# Altium integrated library PS32-lite-revA.IntLib: 20 symbols
Pins are listed as number, name and electrical type; pins without a type are passive.

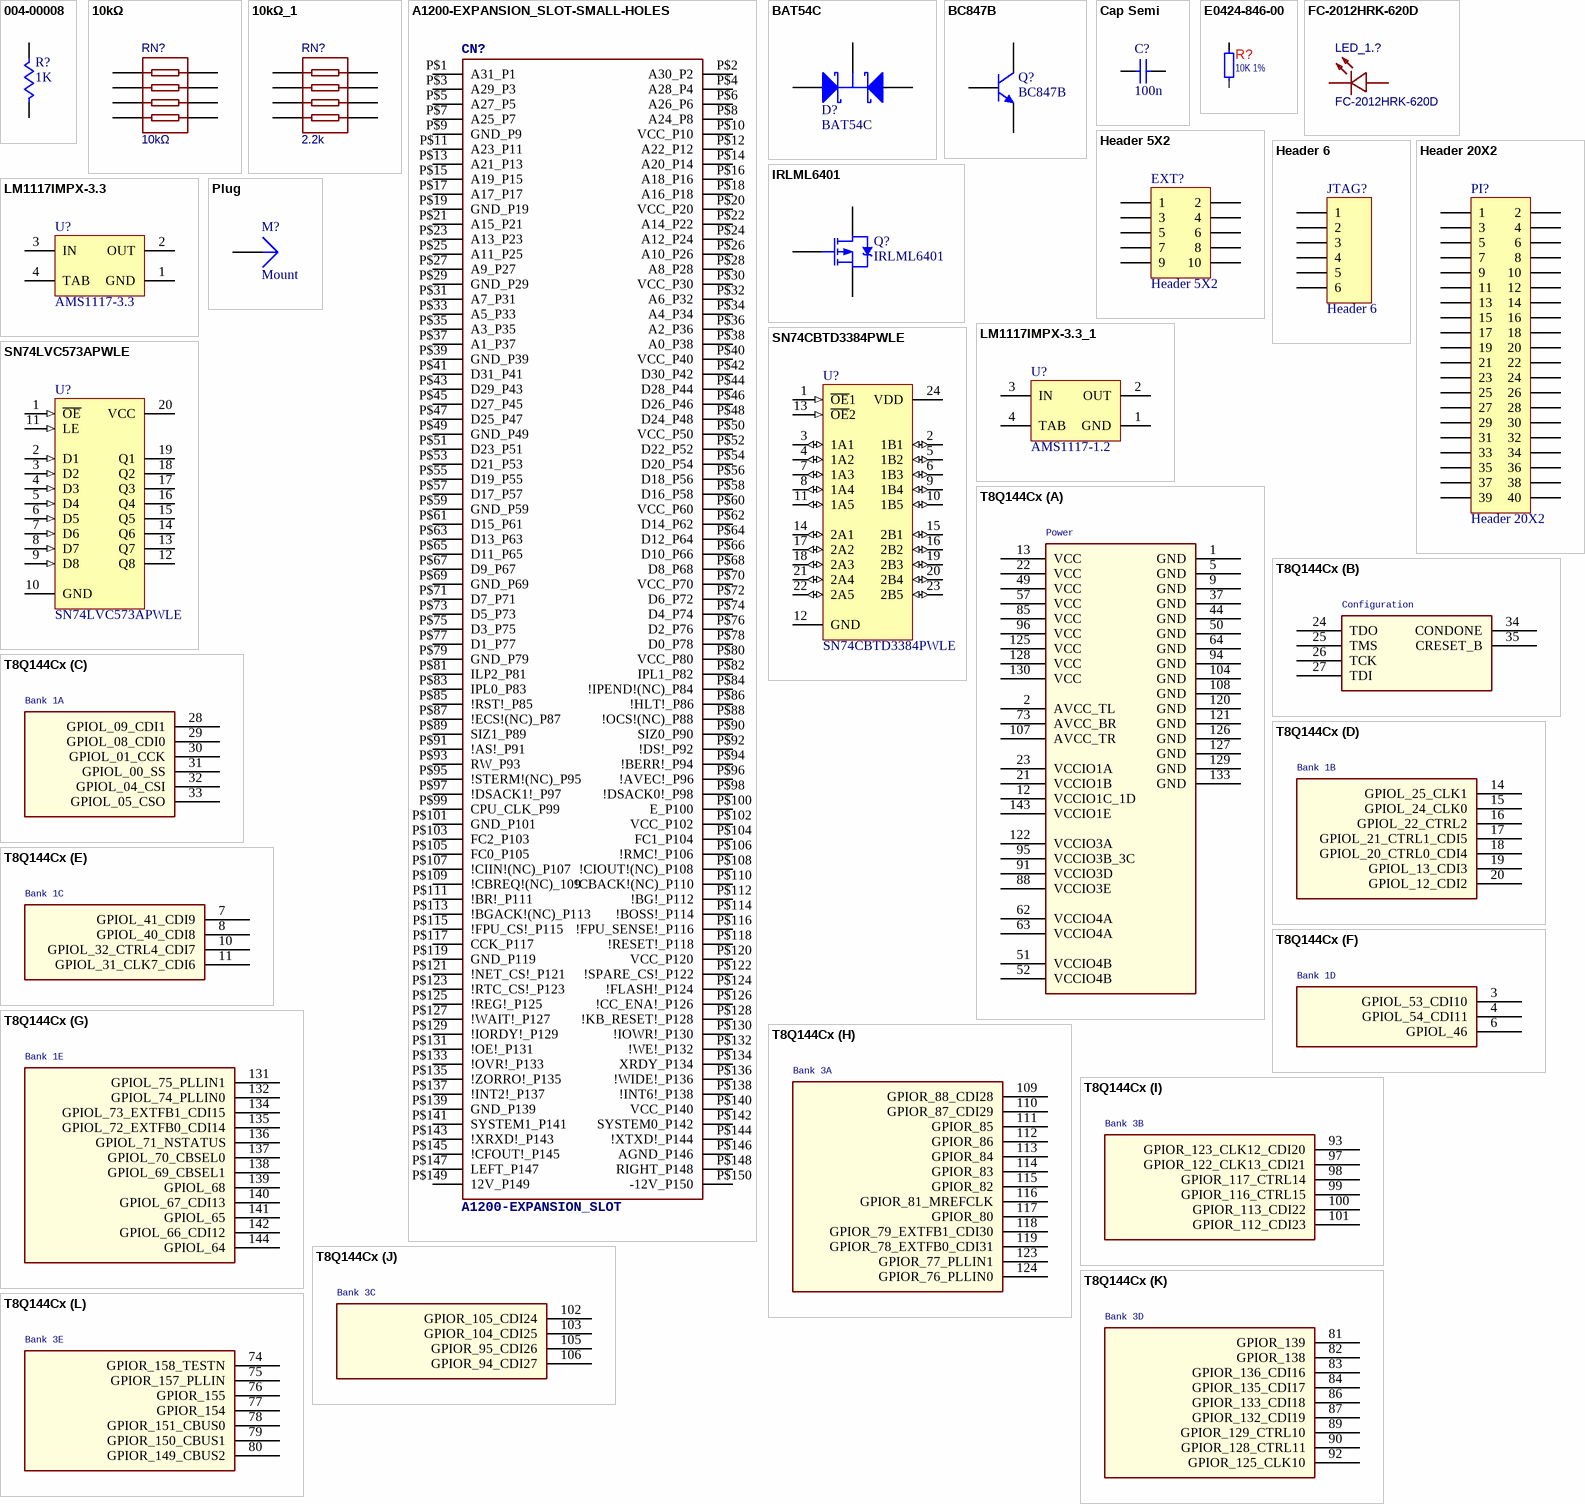
[diagram p0: symbols 004-00008 to T8Q144Cx]

## 004-00008
designator R?, comment 1K
RES 22 OHM 1/16W 5% 0402; Part Number: 009-00020; Manufacturer1 Part Number: RMCF0402JT22R0; Manufacturer1: Stackpole Electronics; Tolerance: 0.05; Value: 22; Power: 1/16W; Package: 1005, EIA 0402, Chip Resistor, 2-Leads, Body 1.00x0.50mm, IPC High Density
footprint 005-00009
footprint 005-00008 (1005, EIA 0402, Chip Capacitor, 2-Leads, Body 1.00x0.50mm, IPC High Density)
footprint 1608[0603] (Chip Capacitor, Body 1.6x0.8mm, IPC High Density)
pins: 1, 2

## 10kΩ
designator RN?
BOM_Manufacturer: UniOhm; BOM_Manufacturer Part: 4D03WGJ0103T5E; nameAlias: Resistance; Resistance (Ohms): 10K; BOM_Supplier: LCSC; BOM_Supplier Part: C29718; BOM_JLCPCB Part Class: Basic Part; spicePre: R; spiceSymbolName: 4D03WGJ0103T5E
footprint RES-ARRAY-SMD_0603-8P-L3.2-W1.6-BL
footprint RES-ARRAY-SMD_0402-8P-L2.0-W1.0-BL (Footprint not found)
footprint RES-ARRAY-SMD_0603-8P-L3.2-W1.6-BL (Footprint not found)
pins: 1, 2, 3, 4, 5, 6, 7, 8

## 10kΩ_1
designator RN?, comment 2.2k
BOM_Manufacturer: UniOhm; BOM_Manufacturer Part: 4D03WGJ0103T5E; nameAlias: Resistance; Resistance (Ohms): 10K; BOM_Supplier: LCSC; BOM_Supplier Part: C29718; BOM_JLCPCB Part Class: Basic Part; spicePre: R; spiceSymbolName: 4D03WGJ0103T5E
footprint RES-ARRAY-SMD_0603-8P-L3.2-W1.6-BL
footprint RES-ARRAY-SMD_0402-8P-L2.0-W1.0-BL (Footprint not found)
footprint RES-ARRAY-SMD_0603-8P-L3.2-W1.6-BL (Footprint not found)
pins: 1, 2, 3, 4, 5, 6, 7, 8

## A1200-EXPANSION_SLOT-SMALL-HOLES
designator CN?, comment A1200-EXPANSION_SLOT
footprint CON_150_SMALL_HOLES
footprint CON_150
pins: P$1 A31_P1, P$2 A30_P2, P$3 A29_P3, P$4 A28_P4, P$5 A27_P5, P$6 A26_P6, P$7 A25_P7, P$8 A24_P8, P$9 GND_P9, P$10 VCC_P10, P$11 A23_P11, P$12 A22_P12, P$13 A21_P13, P$14 A20_P14, P$15 A19_P15, P$16 A18_P16, P$17 A17_P17, P$18 A16_P18, P$19 GND_P19, P$20 VCC_P20, P$21 A15_P21, P$22 A14_P22, P$23 A13_P23, P$24 A12_P24, P$25 A11_P25, P$26 A10_P26, P$27 A9_P27, P$28 A8_P28, P$29 GND_P29, P$30 VCC_P30, P$31 A7_P31, P$32 A6_P32, P$33 A5_P33, P$34 A4_P34, P$35 A3_P35, P$36 A2_P36, P$37 A1_P37, P$38 A0_P38, P$39 GND_P39, P$40 VCC_P40, P$41 D31_P41, P$42 D30_P42, P$43 D29_P43, P$44 D28_P44, P$45 D27_P45, P$46 D26_P46, P$47 D25_P47, P$48 D24_P48, P$49 GND_P49, P$50 VCC_P50, P$51 D23_P51, P$52 D22_P52, P$53 D21_P53, P$54 D20_P54, P$55 D19_P55, P$56 D18_P56, P$57 D17_P57, P$58 D16_P58, P$59 GND_P59, P$60 VCC_P60, P$61 D15_P61, P$62 D14_P62, P$63 D13_P63, P$64 D12_P64, P$65 D11_P65, P$66 D10_P66, P$67 D9_P67, P$68 D8_P68, P$69 GND_P69, P$70 VCC_P70, P$71 D7_P71, P$72 D6_P72, P$73 D5_P73, P$74 D4_P74, P$75 D3_P75, P$76 D2_P76, P$77 D1_P77, P$78 D0_P78, P$79 GND_P79, P$80 VCC_P80, P$81 ILP2_P81, P$82 IPL1_P82, P$83 IPL0_P83, P$84 !IPEND!(NC)_P84, P$85 !RST!_P85, P$86 !HLT!_P86, P$87 !ECS!(NC)_P87, P$88 !OCS!(NC)_P88, P$89 SIZ1_P89, P$90 SIZ0_P90, P$91 !AS!_P91, P$92 !DS!_P92, P$93 RW_P93, P$94 !BERR!_P94, P$95 !STERM!(NC)_P95, P$96 !AVEC!_P96, P$97 !DSACK1!_P97, P$98 !DSACK0!_P98, P$99 CPU_CLK_P99, P$100 E_P100, P$101 GND_P101, P$102 VCC_P102, P$103 FC2_P103, P$104 FC1_P104, P$105 FC0_P105, P$106 !RMC!_P106, P$107 !CIIN!(NC)_P107, P$108 !CIOUT!(NC)_P108, P$109 !CBREQ!(NC)_109, P$110 !CBACK!(NC)_P110, P$111 !BR!_P111, P$112 !BG!_P112, P$113 !BGACK!(NC)_P113, P$114 !BOSS!_P114, P$115 !FPU_CS!_P115, P$116 !FPU_SENSE!_P116, P$117 CCK_P117, P$118 !RESET!_P118, P$119 GND_P119, P$120 VCC_P120, P$121 !NET_CS!_P121, P$122 !SPARE_CS!_P122, P$123 !RTC_CS!_P123, P$124 !FLASH!_P124, P$125 !REG!_P125, P$126 !CC_ENA!_P126, P$127 !WAIT!_P127, P$128 !KB_RESET!_P128, P$129 !IORDY!_P129, P$130 !IOWR!_P130, P$131 !OE!_P131, P$132 !WE!_P132, P$133 !OVR!_P133, P$134 XRDY_P134, P$135 !ZORRO!_P135, P$136 !WIDE!_P136, P$137 !INT2!_P137, P$138 !INT6!_P138, P$139 GND_P139, P$140 VCC_P140, P$141 SYSTEM1_P141, P$142 SYSTEM0_P142, P$143 !XRXD!_P143, P$144 !XTXD!_P144, P$145 !CFOUT!_P145, P$146 AGND_P146, P$147 LEFT_P147, P$148 RIGHT_P148, P$149 12V_P149, P$150 -12V_P150

## BAT54C
designator D?
Schottky Barrier Double Diode; Published: 17-Sep-2003; LatestRevisionDate: 12-Dec-2006; LatestRevisionNote: IPC-7351 Footprint Added.; DatasheetVersion: 4-Mar-2002; PackageVersion: May-1999; PackageReference: SOT23; Publisher: Altium Limited; PackageDescription: 3-Pin SOT-23 Package 0.95 mm Pitch, 2.3 mm Lead Span; ComponentLink1Description: Manufacturer Link; ComponentLink1URL: http://www.semiconductors.philips.com/; ComponentLink2Description: Datasheet; ComponentLink2URL: http://www.semiconductors.philips.com/acrobat/datasheets/BAT54_SERIES_4.pdf
footprint SOT23_N (SOT23, 3-Leads, Body 2.9x1.3mm, Pitch 0.95mm, Lead Span 2.3mm, IPC Medium Density)
footprint SOT23_L (SOT23, 3-Leads, Body 2.9x1.3mm, Pitch 0.95mm, Lead Span 2.3mm, IPC High Density)
footprint SOT23_M (SOT23, 3-Leads, Body 2.9x1.3mm, Pitch 0.95mm, Lead Span 2.3mm, IPC Low Density)
simulation model BAT54C (SUBCKT)
signal-integrity model BAT54C
pins: 1 A1, 2 A2, 3 K

## BC847B
designator Q?
NPN General-purpose Transistor; Published: 17-Sep-2003; LatestRevisionDate: 12-Dec-2006; LatestRevisionNote: IPC-7351 Footprint Added.; DatasheetVersion: 4-Feb-2002; PackageVersion: May-1999; PackageReference: SOT23; Publisher: Altium Limited; PackageDescription: 3-Pin SOT-23 Package 0.95 mm Pitch, 2.3 mm Lead Span; ComponentLink1Description: Manufacturer Link; ComponentLink1URL: http://www.semiconductors.philips.com/; ComponentLink2Description: Datasheet; ComponentLink2URL: http://www.semiconductors.philips.com/acrobat/datasheets/BC846_BC847_BC848_5.pdf
footprint SOT23_N (SOT23, 3-Leads, Body 2.9x1.3mm, Pitch 0.95mm, Lead Span 2.3mm, IPC Medium Density)
footprint SOT23_L (SOT23, 3-Leads, Body 2.9x1.3mm, Pitch 0.95mm, Lead Span 2.3mm, IPC High Density)
footprint SOT23_M (SOT23, 3-Leads, Body 2.9x1.3mm, Pitch 0.95mm, Lead Span 2.3mm, IPC Low Density)
simulation model QBC847B (NPN)
signal-integrity model BC847B
pins: 1 B, 2 E, 3 C

## Cap Semi
designator C?  value 100n  (hidden comment: Cap Semi)
Capacitor (Semiconductor SIM Model); Published: 8-Jun-2000; LatestRevisionDate: 29-May-2009; LatestRevisionNote: IPC-7351 Footprint Added.; PackageReference: C1206; Publisher: Altium Limited; PackageDescription: Chip Capacitor
footprint C1206 (Chip Capacitor, Body 3.2x1.6mm, IPC High Density)
footprint 0402 (Chip Capacitor, Body 1.0x0.5mm, IPC High Density)
footprint C2512 (Chip Capacitor, Body 2.54x1.27mm, IPC High Density)
footprint 1608[0603] (Chip Capacitor, Body 1.6x0.8mm, IPC High Density)
footprint C1210 (Chip Capacitor, Body 3.2x2.5mm, IPC High Density)
simulation model CAP (Semiconductor Capacitor)
signal-integrity model Cap Semi
pins: 1, 2

## E0424-846-00
designator R?  Bauteiltyp (Altium): 10K 1%  (hidden comment: E0424-846-00)
Widerstand; Bauform: 0402; AEC-Q: 200 - Passive Components; Verpackungsart: TR (Tape & Reel); Verpackungseinheit: 10.000; Montagetechnik: SMT (Surface Mount Technology); min  Betriebstemperatur: -55 °C; max  Betriebstemperatur: 155 °C; Materialstatus: 30; Materialkurztext: WID-ME-SMD 10K 0402 1% TK100; Materialart: KAUF; Nennleistung P(n): 0,0625 W; Nennspannung U(n): 50,00 V; Nennwiderstand R(n) in Ohm: 10.000,0000 Ohm; Toleranz: 1,00 %; Technologie: Metalloxid; Temperaturkoeffizient: 100 PPM/K; HelpURL: http://de.wikipedia.org/wiki/Widerstand_(Bauelement); ComponentLink1URL: z.B. http://www.; ComponentLink1Description: Datasheet; Artikel: E0424-846-00; ROHS-Konformitaet: RoHS-Konform
footprint R0402
footprint 1608[0603] (Chip Capacitor, Body 1.6x0.8mm, IPC High Density)
footprint 1608[0603] (Chip Capacitor, Body 1.6x0.8mm, IPC High Density)
pins: 1, 2

## FC-2012HRK-620D
designator LED_1.?
BOM_Manufacturer: NATIONSTAR; BOM_Supplier: LCSC; BOM_Manufacturer Part: FC-2012HRK-620D; BOM_Supplier Part: C84256; BOM_JLCPCB Part Class: Basic Part; spicePre: L; spiceSymbolName: FC-2012HRK-620D
footprint LED0805-RD
pins: 1 -, 2 +

## Header 5X2
designator EXT?
Header, 5-Pin, Dual row; LatestRevisionDate: 17-Jul-2002; LatestRevisionNote: Re-released for DXP Platform.; Publisher: Altium Limited
footprint HDR2X5 (Connector; Header; 5x2 Position)
signal-integrity model Connector
pins: 1, 2, 3, 4, 5, 6, 7, 8, 9, 10

## Header 6
designator JTAG?
Header, 6-Pin; LatestRevisionDate: 17-Jul-2002; LatestRevisionNote: Re-released for DXP Platform.; Publisher: Altium Limited
footprint HDR1X6 (Connector; Header; 6 Position)
signal-integrity model Connector
pins: 1, 2, 3, 4, 5, 6

## Header 20X2
designator PI?
Header, 20-Pin, Dual row; LatestRevisionDate: 17-Jul-2002; LatestRevisionNote: Re-released for DXP Platform.; Publisher: Altium Limited
footprint HDR2X20 (Connector; Header; 20x2 Position)
signal-integrity model Connector
footprint CONN-SMD_FH-00369 (Footprint not found)
pins: 1, 2, 3, 4, 5, 6, 7, 8, 9, 10, 11, 12, 13, 14, 15, 16, 17, 18, 19, 20, 21, 22, 23, 24, 25, 26, 27, 28, 29, 30, 31, 32, 33, 34, 35, 36, 37, 38, 39, 40

## IRLML6401
designator Q?
HEXFET Power MOSFET; Published: 17-Sep-2003; DatasheetVersion: 2-Jul-2001; PackageVersion: Jul-2001; PackageReference: Micro3; Publisher: Altium Limited; PackageDescription: 3-Pin SOT-23 Package 0.95 mm Pitch, 2.3 mm Lead Span; ComponentLink1Description: Manufacturer Link; ComponentLink1URL: http://www.irf.com/; ComponentLink2Description: Datasheet; ComponentLink2URL: http://www.irf.com/product-info/datasheets/data/IRLML6401.pdf
footprint Micro3_N (SOT23, 3-Leads, Body 2.9x1.3mm, Pitch 0.95mm, Lead Span 2.3mm, IPC Medium Density)
footprint Micro3_L (SOT23, 3-Leads, Body 2.9x1.3mm, Pitch 0.95mm, Lead Span 2.3mm, IPC High Density)
footprint Micro3_M (SOT23, 3-Leads, Body 2.9x1.3mm, Pitch 0.95mm, Lead Span 2.3mm, IPC Low Density)
simulation model IRLML6401 (SUBCKT)
pins: 1 G, 2 S, 3 D

## LM1117IMPX-3.3
designator U?, comment AMS1117-3.3
800mA Low-Dropout Linear Regulator, 4-pin SOT-223; PartNumber: LM1117IMPX-3.3; Manufacturer: National Semiconductor; PackageTopMarking: XYTT*N05B; PowerWise: N; CompType: LDO IC; Published: 1-Mar-2010; DatasheetVersion: Apr-2006; PackageVersion: revB, Apr-2003; PackageReference: MP04A; Publisher: Altium Limited; PackageDescription: Molded SOT-223, 6.50 x 3.56 x 1.6mm Body, 4 Lead, 2.3mm Pitch; RoHS: N; PinCount: 4; Code_JEDEC: TO-261-AA; Code_IPC: SOT223-4; ComponentLink1Description: LM1117 Datasheet; ComponentLink1URL: http://www.national.com/ds/LM/LM1117.pdf; ComponentLink2Description: LM1117 Web Page; ComponentLink2URL: http://www.national.com/pf/LM/LM1117.html; ComponentLink3Description: MP04A Package Page; ComponentLink3URL: http://www.national.com/packaging/folders/mp04a.html
footprint MP04A_N (SOT223, 4-Leads, Body 6.5x3.5mm, Pitch 2.3mm, Lead Span 7mm, IPC Medium Density)
footprint MP04A_L (SOT223, 4-Leads, Body 6.5x3.5mm, Pitch 2.3mm, Lead Span 7mm, IPC High Density)
footprint MP04A_M (SOT223, 4-Leads, Body 6.5x3.5mm, Pitch 2.3mm, Lead Span 7mm, IPC Low Density)
pins: 1 GND (power), 2 OUT (power), 3 IN (power), 4 TAB (power)

## LM1117IMPX-3.3_1
designator U?, comment AMS1117-1.2
800mA Low-Dropout Linear Regulator, 4-pin SOT-223; PartNumber: LM1117IMPX-3.3; Manufacturer: National Semiconductor; PackageTopMarking: XYTT*N05B; PowerWise: N; CompType: LDO IC; Published: 1-Mar-2010; DatasheetVersion: Apr-2006; PackageVersion: revB, Apr-2003; PackageReference: MP04A; Publisher: Altium Limited; PackageDescription: Molded SOT-223, 6.50 x 3.56 x 1.6mm Body, 4 Lead, 2.3mm Pitch; RoHS: N; PinCount: 4; Code_JEDEC: TO-261-AA; Code_IPC: SOT223-4; ComponentLink1Description: LM1117 Datasheet; ComponentLink1URL: http://www.national.com/ds/LM/LM1117.pdf; ComponentLink2Description: LM1117 Web Page; ComponentLink2URL: http://www.national.com/pf/LM/LM1117.html; ComponentLink3Description: MP04A Package Page; ComponentLink3URL: http://www.national.com/packaging/folders/mp04a.html
footprint MP04A_N (SOT223, 4-Leads, Body 6.5x3.5mm, Pitch 2.3mm, Lead Span 7mm, IPC Medium Density)
footprint MP04A_L (SOT223, 4-Leads, Body 6.5x3.5mm, Pitch 2.3mm, Lead Span 7mm, IPC High Density)
footprint MP04A_M (SOT223, 4-Leads, Body 6.5x3.5mm, Pitch 2.3mm, Lead Span 7mm, IPC Low Density)
pins: 1 GND (power), 2 OUT (power), 3 IN (power), 4 TAB (power)

## Plug
designator M?, comment Mount
Plug; LatestRevisionDate: 17-Jul-2002; LatestRevisionNote: Re-released for DXP Platform.; Publisher: Altium Limited
footprint PIN1 (Connector; Plug)
signal-integrity model Connector
footprint 9774045151 (SMT Steel Spacer with internal Thread M2.5, height 4.5mm)
pins: 1

## SN74CBTD3384PWLE
designator U?
10-Bit FET Bus Switch with Level Shifting; ComponentAvailability: Obsolete; Published: 8-Jun-2000; LatestRevisionDate: 16-Oct-2006; LatestRevisionNote: IPC-7351 Footprint Added.; DatasheetVersion: Nov-1998; PackageVersion: Feb-1999; PackageReference: PW024; Publisher: Altium Limited; PackageDescription: 24-Pin Thin Small Outline Package 0.65 mm Pitch; ComponentLink1Description: Manufacturer Link; ComponentLink1URL: http://www.ti.com/; ComponentLink2Description: Datasheet; ComponentLink2URL: http://www-s.ti.com/sc/ds/sn74cbtd3384.pdf
footprint PW024_N (TSOP, 24-Leads, Body 7.8x4.4mm, Pitch 0.65mm, IPC Medium Density)
footprint PW024_L (TSOP, 24-Leads, Body 7.8x4.4mm, Pitch 0.65mm, IPC High Density)
footprint PW024_M (TSOP, 24-Leads, Body 7.8x4.4mm, Pitch 0.65mm, IPC Low Density)
3D model PW024 (24-Pin Thin Small Outline Package 0.65 mm Pitch)
footprint PW024_N (TSOP, 24-Leads, Body 7.8x4.4mm, Pitch 0.65mm, IPC Medium Density)
pins: 1 ~{OE}1 (in), 2 1B1 (io), 3 1A1 (io), 4 1A2 (io), 5 1B2 (io), 6 1B3 (io), 7 1A3 (io), 8 1A4 (io), 9 1B4 (io), 10 1B5 (io), 11 1A5 (io), 12 GND (power), 13 ~{OE}2 (in), 14 2A1 (io), 15 2B1 (io), 16 2B2 (io), 17 2A2 (io), 18 2A3 (io), 19 2B3 (io), 20 2B4 (io), 21 2A4 (io), 22 2A5 (io), 23 2B5 (io), 24 VDD (power)

## SN74LVC573APWLE
designator U?
Octal Transparent D-Type Latch with 3-State Outputs; ComponentAvailability: Obsolete; Published: 8-Jun-2000; LatestRevisionDate: 04-Mar-2005; LatestRevisionNote: Stylized 3D Model Added.; DatasheetVersion: Jun-1998; PackageVersion: Feb-1999; PackageReference: PW020; Publisher: Altium Limited; PackageDescription: Shrink Small Outline; 20 Leads; Body Width 4.4 mm; Pitch 0.65 mm; ComponentLink1Description: Manufacturer Link; ComponentLink1URL: http://www.ti.com/; ComponentLink2Description: Datasheet; ComponentLink2URL: http://www-s.ti.com/sc/ds/sn74lvc573a.pdf
footprint PW020 (Shrink Small Outline; 20 Leads; Body Width 4.4 mm; Pitch 0.65 mm)
3D model PW020 (Shrink Small Outline; 20 Leads; Body Width 4.4 mm; Pitch 0.65 mm)
signal-integrity model SN74LVC573APWLE
pins: 1 ~{OE} (in), 2 D1 (in), 3 D2 (in), 4 D3 (in), 5 D4 (in), 6 D5 (in), 7 D6 (in), 8 D7 (in), 9 D8 (in), 10 GND (power), 11 LE (in), 12 Q8 (hiz), 13 Q7 (hiz), 14 Q6 (hiz), 15 Q5 (hiz), 16 Q4 (hiz), 17 Q3 (hiz), 18 Q2 (hiz), 19 Q1 (hiz), 20 VCC (power)

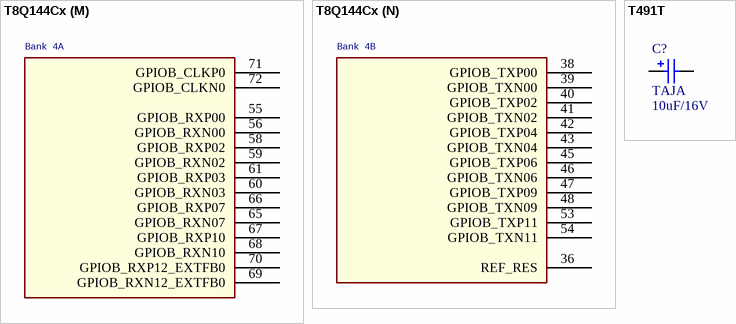
[diagram p1: symbols T8Q144Cx to T491T]

## T8Q144Cx
designator U?  (value not drawn)
SPLIT_INST: TRUE; SWAP_INFO: (S1+S2+S3+S4+S5+S6+S7+S8+S9+S10+S11+S12+S13+S14)
footprint LQFP144
footprint TSQFP50P2200X2200X160-144L (TSQFP, 144-Leads, Body 20,00x20,00mm, Pitch 0,50mm, IPC High Density)
part A pins: 1 GND (power), 2 AVCC_TL (power), 5 GND (power), 9 GND (power), 12 VCCIO1C_1D (power), 13 VCC (power), 21 VCCIO1B (power), 22 VCC (power), 23 VCCIO1A (power), 37 GND (power), 44 GND (power), 49 VCC (power), 50 GND (power), 51 VCCIO4B (power), 52 VCCIO4B (power), 57 VCC (power), 62 VCCIO4A (power), 63 VCCIO4A (power), 64 GND (power), 73 AVCC_BR (power), 85 VCC (power), 88 VCCIO3E (power), 91 VCCIO3D (power), 94 GND (power), 95 VCCIO3B_3C (power), 96 VCC (power), 104 GND (power), 107 AVCC_TR (power), 108 GND (power), 120 GND (power), 121 GND (power), 122 VCCIO3A (power), 125 VCC (power), 126 GND (power), 127 GND (power), 128 VCC (power), 129 GND (power), 130 VCC (power), 133 GND (power), 143 VCCIO1E (power)
part B pins: 24 TDO, 25 TMS, 26 TCK, 27 TDI, 34 CONDONE, 35 CRESET_B
part C pins: 28 GPIOL_09_CDI1, 29 GPIOL_08_CDI0, 30 GPIOL_01_CCK, 31 GPIOL_00_SS, 32 GPIOL_04_CSI, 33 GPIOL_05_CSO
part D pins: 14 GPIOL_25_CLK1, 15 GPIOL_24_CLK0, 16 GPIOL_22_CTRL2, 17 GPIOL_21_CTRL1_CDI5, 18 GPIOL_20_CTRL0_CDI4, 19 GPIOL_13_CDI3, 20 GPIOL_12_CDI2
part E pins: 7 GPIOL_41_CDI9, 8 GPIOL_40_CDI8, 10 GPIOL_32_CTRL4_CDI7, 11 GPIOL_31_CLK7_CDI6
part F pins: 3 GPIOL_53_CDI10, 4 GPIOL_54_CDI11, 6 GPIOL_46
part G pins: 131 GPIOL_75_PLLIN1, 132 GPIOL_74_PLLIN0, 134 GPIOL_73_EXTFB1_CDI15, 135 GPIOL_72_EXTFB0_CDI14, 136 GPIOL_71_NSTATUS, 137 GPIOL_70_CBSEL0, 138 GPIOL_69_CBSEL1, 139 GPIOL_68, 140 GPIOL_67_CDI13, 141 GPIOL_65, 142 GPIOL_66_CDI12, 144 GPIOL_64
part H pins: 109 GPIOR_88_CDI28, 110 GPIOR_87_CDI29, 111 GPIOR_85, 112 GPIOR_86, 113 GPIOR_84, 114 GPIOR_83, 115 GPIOR_82, 116 GPIOR_81_MREFCLK, 117 GPIOR_80, 118 GPIOR_79_EXTFB1_CDI30, 119 GPIOR_78_EXTFB0_CDI31, 123 GPIOR_77_PLLIN1, 124 GPIOR_76_PLLIN0
part I pins: 93 GPIOR_123_CLK12_CDI20, 97 GPIOR_122_CLK13_CDI21, 98 GPIOR_117_CTRL14, 99 GPIOR_116_CTRL15, 100 GPIOR_113_CDI22, 101 GPIOR_112_CDI23
part J pins: 102 GPIOR_105_CDI24, 103 GPIOR_104_CDI25, 105 GPIOR_95_CDI26, 106 GPIOR_94_CDI27
part K pins: 81 GPIOR_139, 82 GPIOR_138, 83 GPIOR_136_CDI16, 84 GPIOR_135_CDI17, 86 GPIOR_133_CDI18, 87 GPIOR_132_CDI19, 89 GPIOR_129_CTRL10, 90 GPIOR_128_CTRL11, 92 GPIOR_125_CLK10
part L pins: 74 GPIOR_158_TESTN, 75 GPIOR_157_PLLIN, 76 GPIOR_155, 77 GPIOR_154, 78 GPIOR_151_CBUS0, 79 GPIOR_150_CBUS1, 80 GPIOR_149_CBUS2
part M pins: 55 GPIOB_RXP00, 56 GPIOB_RXN00, 58 GPIOB_RXP02, 59 GPIOB_RXN02, 60 GPIOB_RXN03, 61 GPIOB_RXP03, 65 GPIOB_RXN07, 66 GPIOB_RXP07, 67 GPIOB_RXP10, 68 GPIOB_RXN10, 69 GPIOB_RXN12_EXTFB0, 70 GPIOB_RXP12_EXTFB0, 71 GPIOB_CLKP0, 72 GPIOB_CLKN0
part N pins: 36 REF_RES, 38 GPIOB_TXP00, 39 GPIOB_TXN00, 40 GPIOB_TXP02, 41 GPIOB_TXN02, 42 GPIOB_TXP04, 43 GPIOB_TXN04, 45 GPIOB_TXP06, 46 GPIOB_TXN06, 47 GPIOB_TXP09, 48 GPIOB_TXN09, 53 GPIOB_TXP11, 54 GPIOB_TXN11
part A text: Power
part B text: Configuration
part C text: Bank 1A
part D text: Bank 1B
part E text: Bank 1C
part F text: Bank 1D
part G text: Bank 1E
part H text: Bank 3A
part I text: Bank 3B
part J text: Bank 3C
part K text: Bank 3D
part L text: Bank 3E
part M text: Bank 4A
part N text: Bank 4B

## T491T
designator C?, comment TAJA  value 10uF/16V
Solid Tantalum Chip Capacitor, Low Profile T491 Series - Industrial Grade; Published: 17-Jul-2002; LatestRevisionDate: 19-Mar-2004; LatestRevisionNote: Silkscreen dimensions re-sized.; DatasheetDocument: Mar-2001; PackageDocument: Mar-2001; PackageReference: T; Publisher: Altium Limited; Code_JEITA: 3528-12; ComponentLink1Description: Manufacturer Link; ComponentLink1URL: http://www.kemet.com/; ComponentLink2Description: Datasheet; ComponentLink2URL: http://www.kemet.com/kemet/web/homepage/kechome.nsf/vapubfilesname/F3102TA.pdf/$file/F3102TA.pdf
footprint T (Capacitor, SM Tantalum; Body 3.5 x 2.8 mm (LxW typ))
simulation model CAP (Capacitor)
signal-integrity model T491T
pins: 1, 2
1 alternate drawing of the same symbol